# Altium schematic symbol library jlcpcb_2025_04_capacitors_extended_1206.schlib: 2503 symbols (part 3 of 14) (continued)
## 1206F104Z500CT
designator C?  Capacitance: 100nF  (hidden comment: *)
Capacitor, Ceramic (MLCC), 100nF, 50V, Y5V, SMD 1206; Manufacturer: Walsin Tech Corp; Manufacturer Part Number: 1206F104Z500CT; Temperature Rating: -20%~+80%; Package Size: 1206; JLCPCB Basic Part: No; JLCPCB Part Number: C152824; Supplier 1: LCSC; Category: Capacitors - MLCC; Supplier Part Number 1: C152824; Voltage Rating: 50V; Temperature Coefficient: Y5V; RoHS: Yes; ComponentLink1Description: Datasheet; ComponentLink1URL: https://wmsc.lcsc.com/wmsc/upload/file/pdf/v2/lcsc/2304140030_Walsin-Tech-Corp-1206F104Z500CT_C152824.pdf; ComponentLink2Description: JLCPCB Part URL; ComponentLink2URL: https://jlcpcb.com/partdetail/C152824; ComponentLink3Description: LCSC Part URL; ComponentLink3URL: https://lcsc.com/product-detail/Multilayer-Ceramic-Capacitors-MLCC---SMD-SMT_Walsin-Tech-Corp-Walsin-Tech-Corp-1206F104Z500CT_C152824.html
footprint CAP-1206 (1206 (3216M) Capacitor)
pins: 1, 2

## 1206F105M500NT
designator C?  Capacitance: 1uF  (hidden comment: *)
Capacitor, Ceramic (MLCC), 1uF, ±20%, 50V, Y5V, ±20%, SMD 1206; Manufacturer: FH(Guangdong Fenghua Advanced Tech); Manufacturer Part Number: 1206F105M500NT; Package Size: 1206; JLCPCB Basic Part: No; JLCPCB Part Number: C1926; Supplier 1: LCSC; Category: Capacitors - MLCC; Supplier Part Number 1: C1926; Tolerance: ±20%; Voltage Rating: 50V; Temperature Coefficient: Y5V; RoHS: Yes; ComponentLink1Description: Datasheet; ComponentLink1URL: https://wmsc.lcsc.com/wmsc/upload/file/pdf/v2/lcsc/2304140030_FH--Guangdong-Fenghua-Advanced-Tech-1206F105M500NT_C1926.pdf; ComponentLink2Description: JLCPCB Part URL; ComponentLink2URL: https://jlcpcb.com/partdetail/C1926; ComponentLink3Description: LCSC Part URL; ComponentLink3URL: https://lcsc.com/product-detail/Multilayer-Ceramic-Capacitors-MLCC---SMD-SMT_FH-Guangdong-Fenghua-Advanced-Tech-FH-Guangdong-Fenghua-Advanced-Tech-1206F105M500NT_C1926.html
footprint CAP-1206 (1206 (3216M) Capacitor)
pins: 1, 2

## 1206F105Z160CT
designator C?  Capacitance: 1uF  (hidden comment: *)
Capacitor, Ceramic (MLCC), 1uF, 16V, Y5V, SMD 1206; Manufacturer: Walsin Tech Corp; Manufacturer Part Number: 1206F105Z160CT; Temperature Rating: -20%~+80%; Package Size: 1206; JLCPCB Basic Part: No; JLCPCB Part Number: C408911; Supplier 1: LCSC; Category: Capacitors - MLCC; Supplier Part Number 1: C408911; Voltage Rating: 16V; Temperature Coefficient: Y5V; RoHS: Yes; ComponentLink1Description: Datasheet; ComponentLink1URL: https://wmsc.lcsc.com/wmsc/upload/file/pdf/v2/lcsc/2304140030_Walsin-Tech-Corp-1206F105Z160CT_C408911.pdf; ComponentLink2Description: JLCPCB Part URL; ComponentLink2URL: https://jlcpcb.com/partdetail/C408911; ComponentLink3Description: LCSC Part URL; ComponentLink3URL: https://lcsc.com/product-detail/Multilayer-Ceramic-Capacitors-MLCC---SMD-SMT_Walsin-Tech-Corp-Walsin-Tech-Corp-1206F105Z160CT_C408911.html
footprint CAP-1206 (1206 (3216M) Capacitor)
pins: 1, 2

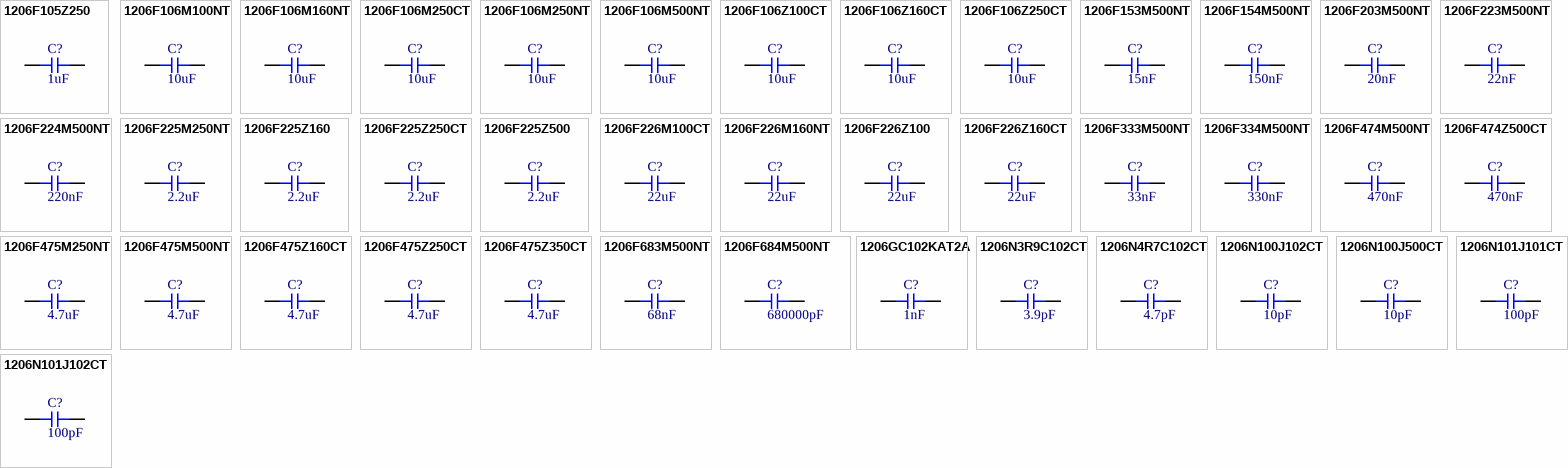
[diagram p10: symbols 1206F105Z250 to 1206N101J102CT]

## 1206F105Z250
designator C?  Capacitance: 1uF  (hidden comment: *)
Capacitor, Ceramic (MLCC), 1uF, 25V, Y5V, SMD 1206; Manufacturer: Walsin Tech Corp; Manufacturer Part Number: 1206F105Z250; Temperature Rating: -20%~+80%; Package Size: 1206; JLCPCB Basic Part: No; JLCPCB Part Number: C123660; Supplier 1: LCSC; Category: Capacitors - MLCC; Supplier Part Number 1: C123660; Voltage Rating: 25V; Temperature Coefficient: Y5V; RoHS: Yes; ComponentLink1Description: Datasheet; ComponentLink1URL: https://wmsc.lcsc.com/wmsc/upload/file/pdf/v2/lcsc/2304140030_Walsin-Tech-Corp-1206F105Z250_C123660.pdf; ComponentLink2Description: JLCPCB Part URL; ComponentLink2URL: https://jlcpcb.com/partdetail/C123660; ComponentLink3Description: LCSC Part URL; ComponentLink3URL: https://lcsc.com/product-detail/Multilayer-Ceramic-Capacitors-MLCC---SMD-SMT_Walsin-Tech-Corp-Walsin-Tech-Corp-1206F105Z250_C123660.html
footprint CAP-1206 (1206 (3216M) Capacitor)
pins: 1, 2

## 1206F106M100NT
designator C?  Capacitance: 10uF  (hidden comment: *)
Capacitor, Ceramic (MLCC), 10uF, ±20%, 16V, Y5V, ±20%, SMD 1206; Manufacturer: FH(Guangdong Fenghua Advanced Tech); Manufacturer Part Number: 1206F106M100NT; Package Size: 1206; JLCPCB Basic Part: No; JLCPCB Part Number: C138602; Supplier 1: LCSC; Category: Capacitors - MLCC; Supplier Part Number 1: C138602; Tolerance: ±20%; Voltage Rating: 16V; Temperature Coefficient: Y5V; RoHS: Yes; ComponentLink1Description: Datasheet; ComponentLink1URL: https://wmsc.lcsc.com/wmsc/upload/file/pdf/v2/lcsc/2304140030_FH--Guangdong-Fenghua-Advanced-Tech-1206F106M100NT_C138602.pdf; ComponentLink2Description: JLCPCB Part URL; ComponentLink2URL: https://jlcpcb.com/partdetail/C138602; ComponentLink3Description: LCSC Part URL; ComponentLink3URL: https://lcsc.com/product-detail/Multilayer-Ceramic-Capacitors-MLCC---SMD-SMT_FH-Guangdong-Fenghua-Advanced-Tech-FH-Guangdong-Fenghua-Advanced-Tech-1206F106M100NT_C138602.html
footprint CAP-1206 (1206 (3216M) Capacitor)
pins: 1, 2

## 1206F106M160NT
designator C?  Capacitance: 10uF  (hidden comment: *)
Capacitor, Ceramic (MLCC), 10uF, ±20%, 16V, Y5V, ±20%, SMD 1206; Manufacturer: FH(Guangdong Fenghua Advanced Tech); Manufacturer Part Number: 1206F106M160NT; Package Size: 1206; JLCPCB Basic Part: No; JLCPCB Part Number: C105476; Supplier 1: LCSC; Category: Capacitors - MLCC; Supplier Part Number 1: C105476; Tolerance: ±20%; Voltage Rating: 16V; Temperature Coefficient: Y5V; RoHS: Yes; ComponentLink1Description: Datasheet; ComponentLink1URL: https://wmsc.lcsc.com/wmsc/upload/file/pdf/v2/lcsc/2304140030_FH--Guangdong-Fenghua-Advanced-Tech-1206F106M160NT_C105476.pdf; ComponentLink2Description: JLCPCB Part URL; ComponentLink2URL: https://jlcpcb.com/partdetail/C105476; ComponentLink3Description: LCSC Part URL; ComponentLink3URL: https://lcsc.com/product-detail/Multilayer-Ceramic-Capacitors-MLCC---SMD-SMT_FH-Guangdong-Fenghua-Advanced-Tech-FH-Guangdong-Fenghua-Advanced-Tech-1206F106M160NT_C105476.html
footprint CAP-1206 (1206 (3216M) Capacitor)
pins: 1, 2

## 1206F106M250CT
designator C?  Capacitance: 10uF  (hidden comment: *)
Capacitor, Ceramic (MLCC), 10uF, ±20%, 25V, Y5V, ±20%, SMD 1206; Manufacturer: Walsin Tech Corp; Manufacturer Part Number: 1206F106M250CT; Package Size: 1206; JLCPCB Basic Part: No; JLCPCB Part Number: C296109; Supplier 1: LCSC; Category: Capacitors - MLCC; Supplier Part Number 1: C296109; Tolerance: ±20%; Voltage Rating: 25V; Temperature Coefficient: Y5V; RoHS: Yes; ComponentLink1Description: Datasheet; ComponentLink1URL: https://wmsc.lcsc.com/wmsc/upload/file/pdf/v2/lcsc/2304140030_Walsin-Tech-Corp-1206F106M250CT_C296109.pdf; ComponentLink2Description: JLCPCB Part URL; ComponentLink2URL: https://jlcpcb.com/partdetail/C296109; ComponentLink3Description: LCSC Part URL; ComponentLink3URL: https://lcsc.com/product-detail/Multilayer-Ceramic-Capacitors-MLCC---SMD-SMT_Walsin-Tech-Corp-Walsin-Tech-Corp-1206F106M250CT_C296109.html
footprint CAP-1206 (1206 (3216M) Capacitor)
pins: 1, 2

## 1206F106M250NT
designator C?  Capacitance: 10uF  (hidden comment: *)
Capacitor, Ceramic (MLCC), 10uF, 25V, Y5V, SMD 1206; Manufacturer: FH(Guangdong Fenghua Advanced Tech); Manufacturer Part Number: 1206F106M250NT; Package Size: 1206; JLCPCB Basic Part: No; JLCPCB Part Number: C3034761; Supplier 1: LCSC; Category: Capacitors - MLCC; Supplier Part Number 1: C3034761; Voltage Rating: 25V; Temperature Coefficient: Y5V; RoHS: Yes; ComponentLink1Description: Datasheet; ComponentLink1URL: https://wmsc.lcsc.com/wmsc/upload/file/pdf/v2/lcsc/2206101730_FH--Guangdong-Fenghua-Advanced-Tech-1206F106M250NT_C3034761.pdf; ComponentLink2Description: JLCPCB Part URL; ComponentLink2URL: https://jlcpcb.com/partdetail/C3034761; ComponentLink3Description: LCSC Part URL; ComponentLink3URL: https://lcsc.com/product-detail/Multilayer-Ceramic-Capacitors-MLCC---SMD-SMT_FH-Guangdong-Fenghua-Advanced-Tech-FH-Guangdong-Fenghua-Advanced-Tech-1206F106M250NT_C3034761.html
footprint CAP-1206 (1206 (3216M) Capacitor)
pins: 1, 2

## 1206F106M500NT
designator C?  Capacitance: 10uF  (hidden comment: *)
Capacitor, Ceramic (MLCC), 10uF, ±20%, 50V, Y5V, ±20%, SMD 1206; Manufacturer: FH(Guangdong Fenghua Advanced Tech); Manufacturer Part Number: 1206F106M500NT; Package Size: 1206; JLCPCB Basic Part: No; JLCPCB Part Number: C110256; Supplier 1: LCSC; Category: Capacitors - MLCC; Supplier Part Number 1: C110256; Tolerance: ±20%; Voltage Rating: 50V; Temperature Coefficient: Y5V; RoHS: Yes; ComponentLink1Description: Datasheet; ComponentLink1URL: https://wmsc.lcsc.com/wmsc/upload/file/pdf/v2/lcsc/2304140030_FH--Guangdong-Fenghua-Advanced-Tech-1206F106M500NT_C110256.pdf; ComponentLink2Description: JLCPCB Part URL; ComponentLink2URL: https://jlcpcb.com/partdetail/C110256; ComponentLink3Description: LCSC Part URL; ComponentLink3URL: https://lcsc.com/product-detail/Multilayer-Ceramic-Capacitors-MLCC---SMD-SMT_FH-Guangdong-Fenghua-Advanced-Tech-FH-Guangdong-Fenghua-Advanced-Tech-1206F106M500NT_C110256.html
footprint CAP-1206 (1206 (3216M) Capacitor)
pins: 1, 2

## 1206F106Z100CT
designator C?  Capacitance: 10uF  (hidden comment: *)
Capacitor, Ceramic (MLCC), 10uF, 10V, Y5V, SMD 1206; Manufacturer: Walsin Tech Corp; Manufacturer Part Number: 1206F106Z100CT; Temperature Rating: -20%~+80%; Package Size: 1206; JLCPCB Basic Part: No; JLCPCB Part Number: C152957; Supplier 1: LCSC; Category: Capacitors - MLCC; Supplier Part Number 1: C152957; Voltage Rating: 10V; Temperature Coefficient: Y5V; RoHS: Yes; ComponentLink1Description: Datasheet; ComponentLink1URL: https://wmsc.lcsc.com/wmsc/upload/file/pdf/v2/lcsc/2304140030_Walsin-Tech-Corp-1206F106Z100CT_C152957.pdf; ComponentLink2Description: JLCPCB Part URL; ComponentLink2URL: https://jlcpcb.com/partdetail/C152957; ComponentLink3Description: LCSC Part URL; ComponentLink3URL: https://lcsc.com/product-detail/Multilayer-Ceramic-Capacitors-MLCC---SMD-SMT_Walsin-Tech-Corp-Walsin-Tech-Corp-1206F106Z100CT_C152957.html
footprint CAP-1206 (1206 (3216M) Capacitor)
pins: 1, 2

## 1206F106Z160CT
designator C?  Capacitance: 10uF  (hidden comment: *)
Capacitor, Ceramic (MLCC), 10uF, 16V, Y5V, SMD 1206; Manufacturer: Walsin Tech Corp; Manufacturer Part Number: 1206F106Z160CT; Temperature Rating: -20%~+80%; Package Size: 1206; JLCPCB Basic Part: No; JLCPCB Part Number: C396769; Supplier 1: LCSC; Category: Capacitors - MLCC; Supplier Part Number 1: C396769; Voltage Rating: 16V; Temperature Coefficient: Y5V; RoHS: Yes; ComponentLink1Description: Datasheet; ComponentLink1URL: https://wmsc.lcsc.com/wmsc/upload/file/pdf/v2/lcsc/2304140030_Walsin-Tech-Corp-1206F106Z160CT_C396769.pdf; ComponentLink2Description: JLCPCB Part URL; ComponentLink2URL: https://jlcpcb.com/partdetail/C396769; ComponentLink3Description: LCSC Part URL; ComponentLink3URL: https://lcsc.com/product-detail/Multilayer-Ceramic-Capacitors-MLCC---SMD-SMT_Walsin-Tech-Corp-Walsin-Tech-Corp-1206F106Z160CT_C396769.html
footprint CAP-1206 (1206 (3216M) Capacitor)
pins: 1, 2

## 1206F106Z250CT
designator C?  Capacitance: 10uF  (hidden comment: *)
Capacitor, Ceramic (MLCC), 10uF, 25V, Y5V, SMD 1206; Manufacturer: Walsin Tech Corp; Manufacturer Part Number: 1206F106Z250CT; Temperature Rating: -20%~+80%; Package Size: 1206; JLCPCB Basic Part: No; JLCPCB Part Number: C296110; Supplier 1: LCSC; Category: Capacitors - MLCC; Supplier Part Number 1: C296110; Voltage Rating: 25V; Temperature Coefficient: Y5V; RoHS: Yes; ComponentLink1Description: Datasheet; ComponentLink1URL: https://wmsc.lcsc.com/wmsc/upload/file/pdf/v2/lcsc/2304140030_Walsin-Tech-Corp-1206F106Z250CT_C296110.pdf; ComponentLink2Description: JLCPCB Part URL; ComponentLink2URL: https://jlcpcb.com/partdetail/C296110; ComponentLink3Description: LCSC Part URL; ComponentLink3URL: https://lcsc.com/product-detail/Multilayer-Ceramic-Capacitors-MLCC---SMD-SMT_Walsin-Tech-Corp-Walsin-Tech-Corp-1206F106Z250CT_C296110.html
footprint CAP-1206 (1206 (3216M) Capacitor)
pins: 1, 2

## 1206F153M500NT
designator C?  Capacitance: 15nF  (hidden comment: *)
Capacitor, Ceramic (MLCC), 15nF, ±20%, 50V, Y5V, ±20%, SMD 1206; Manufacturer: FH(Guangdong Fenghua Advanced Tech); Manufacturer Part Number: 1206F153M500NT; Package Size: 1206; JLCPCB Basic Part: No; JLCPCB Part Number: C1928; Supplier 1: LCSC; Category: Capacitors - MLCC; Supplier Part Number 1: C1928; Tolerance: ±20%; Voltage Rating: 50V; Temperature Coefficient: Y5V; RoHS: Yes; ComponentLink1Description: Datasheet; ComponentLink1URL: https://wmsc.lcsc.com/wmsc/upload/file/pdf/v2/lcsc/2304140030_FH--Guangdong-Fenghua-Advanced-Tech-1206F153M500NT_C1928.pdf; ComponentLink2Description: JLCPCB Part URL; ComponentLink2URL: https://jlcpcb.com/partdetail/C1928; ComponentLink3Description: LCSC Part URL; ComponentLink3URL: https://lcsc.com/product-detail/Multilayer-Ceramic-Capacitors-MLCC---SMD-SMT_FH-Guangdong-Fenghua-Advanced-Tech-FH-Guangdong-Fenghua-Advanced-Tech-1206F153M500NT_C1928.html
footprint CAP-1206 (1206 (3216M) Capacitor)
pins: 1, 2

## 1206F154M500NT
designator C?  Capacitance: 150nF  (hidden comment: *)
Capacitor, Ceramic (MLCC), 150nF, ±20%, 50V, Y5V, ±20%, SMD 1206; Manufacturer: FH(Guangdong Fenghua Advanced Tech); Manufacturer Part Number: 1206F154M500NT; Package Size: 1206; JLCPCB Basic Part: No; JLCPCB Part Number: C1929; Supplier 1: LCSC; Category: Capacitors - MLCC; Supplier Part Number 1: C1929; Tolerance: ±20%; Voltage Rating: 50V; Temperature Coefficient: Y5V; RoHS: Yes; ComponentLink1Description: Datasheet; ComponentLink1URL: https://wmsc.lcsc.com/wmsc/upload/file/pdf/v2/lcsc/2304140030_FH--Guangdong-Fenghua-Advanced-Tech-1206F154M500NT_C1929.pdf; ComponentLink2Description: JLCPCB Part URL; ComponentLink2URL: https://jlcpcb.com/partdetail/C1929; ComponentLink3Description: LCSC Part URL; ComponentLink3URL: https://lcsc.com/product-detail/Multilayer-Ceramic-Capacitors-MLCC---SMD-SMT_FH-Guangdong-Fenghua-Advanced-Tech-FH-Guangdong-Fenghua-Advanced-Tech-1206F154M500NT_C1929.html
footprint CAP-1206 (1206 (3216M) Capacitor)
pins: 1, 2

## 1206F203M500NT
designator C?  Capacitance: 20nF  (hidden comment: *)
Capacitor, Ceramic (MLCC), 20nF, ±20%, 50V, Y5V, ±20%, SMD 1206; Manufacturer: FH(Guangdong Fenghua Advanced Tech); Manufacturer Part Number: 1206F203M500NT; Package Size: 1206; JLCPCB Basic Part: No; JLCPCB Part Number: C1930; Supplier 1: LCSC; Category: Capacitors - MLCC; Supplier Part Number 1: C1930; Tolerance: ±20%; Voltage Rating: 50V; Temperature Coefficient: Y5V; RoHS: Yes; ComponentLink1Description: Datasheet; ComponentLink1URL: https://wmsc.lcsc.com/wmsc/upload/file/pdf/v2/lcsc/2304140030_FH--Guangdong-Fenghua-Advanced-Tech-1206F203M500NT_C1930.pdf; ComponentLink2Description: JLCPCB Part URL; ComponentLink2URL: https://jlcpcb.com/partdetail/C1930; ComponentLink3Description: LCSC Part URL; ComponentLink3URL: https://lcsc.com/product-detail/Multilayer-Ceramic-Capacitors-MLCC---SMD-SMT_FH-Guangdong-Fenghua-Advanced-Tech-FH-Guangdong-Fenghua-Advanced-Tech-1206F203M500NT_C1930.html
footprint CAP-1206 (1206 (3216M) Capacitor)
pins: 1, 2

## 1206F223M500NT
designator C?  Capacitance: 22nF  (hidden comment: *)
Capacitor, Ceramic (MLCC), 22nF, ±20%, 50V, Y5V, ±20%, SMD 1206; Manufacturer: FH(Guangdong Fenghua Advanced Tech); Manufacturer Part Number: 1206F223M500NT; Package Size: 1206; JLCPCB Basic Part: No; JLCPCB Part Number: C1931; Supplier 1: LCSC; Category: Capacitors - MLCC; Supplier Part Number 1: C1931; Tolerance: ±20%; Voltage Rating: 50V; Temperature Coefficient: Y5V; RoHS: Yes; ComponentLink1Description: Datasheet; ComponentLink1URL: https://wmsc.lcsc.com/wmsc/upload/file/pdf/v2/lcsc/2304140030_FH--Guangdong-Fenghua-Advanced-Tech-1206F223M500NT_C1931.pdf; ComponentLink2Description: JLCPCB Part URL; ComponentLink2URL: https://jlcpcb.com/partdetail/C1931; ComponentLink3Description: LCSC Part URL; ComponentLink3URL: https://lcsc.com/product-detail/Multilayer-Ceramic-Capacitors-MLCC---SMD-SMT_FH-Guangdong-Fenghua-Advanced-Tech-FH-Guangdong-Fenghua-Advanced-Tech-1206F223M500NT_C1931.html
footprint CAP-1206 (1206 (3216M) Capacitor)
pins: 1, 2

## 1206F224M500NT
designator C?  Capacitance: 220nF  (hidden comment: *)
Capacitor, Ceramic (MLCC), 220nF, ±20%, 50V, Y5V, ±20%, SMD 1206; Manufacturer: FH(Guangdong Fenghua Advanced Tech); Manufacturer Part Number: 1206F224M500NT; Package Size: 1206; JLCPCB Basic Part: No; JLCPCB Part Number: C1932; Supplier 1: LCSC; Category: Capacitors - MLCC; Supplier Part Number 1: C1932; Tolerance: ±20%; Voltage Rating: 50V; Temperature Coefficient: Y5V; RoHS: Yes; ComponentLink1Description: Datasheet; ComponentLink1URL: https://wmsc.lcsc.com/wmsc/upload/file/pdf/v2/lcsc/2304140030_FH--Guangdong-Fenghua-Advanced-Tech-1206F224M500NT_C1932.pdf; ComponentLink2Description: JLCPCB Part URL; ComponentLink2URL: https://jlcpcb.com/partdetail/C1932; ComponentLink3Description: LCSC Part URL; ComponentLink3URL: https://lcsc.com/product-detail/Multilayer-Ceramic-Capacitors-MLCC---SMD-SMT_FH-Guangdong-Fenghua-Advanced-Tech-FH-Guangdong-Fenghua-Advanced-Tech-1206F224M500NT_C1932.html
footprint CAP-1206 (1206 (3216M) Capacitor)
pins: 1, 2

## 1206F225M250NT
designator C?  Capacitance: 2.2uF  (hidden comment: *)
Capacitor, Ceramic (MLCC), 2.2uF, ±20%, 25V, Y5V, ±20%, SMD 1206; Manufacturer: FH(Guangdong Fenghua Advanced Tech); Manufacturer Part Number: 1206F225M250NT; Package Size: 1206; JLCPCB Basic Part: No; JLCPCB Part Number: C1933; Supplier 1: LCSC; Category: Capacitors - MLCC; Supplier Part Number 1: C1933; Tolerance: ±20%; Voltage Rating: 25V; Temperature Coefficient: Y5V; RoHS: Yes; ComponentLink1Description: Datasheet; ComponentLink1URL: https://wmsc.lcsc.com/wmsc/upload/file/pdf/v2/lcsc/2304140030_FH--Guangdong-Fenghua-Advanced-Tech-1206F225M250NT_C1933.pdf; ComponentLink2Description: JLCPCB Part URL; ComponentLink2URL: https://jlcpcb.com/partdetail/C1933; ComponentLink3Description: LCSC Part URL; ComponentLink3URL: https://lcsc.com/product-detail/Multilayer-Ceramic-Capacitors-MLCC---SMD-SMT_FH-Guangdong-Fenghua-Advanced-Tech-FH-Guangdong-Fenghua-Advanced-Tech-1206F225M250NT_C1933.html
footprint CAP-1206 (1206 (3216M) Capacitor)
pins: 1, 2

## 1206F225Z160
designator C?  Capacitance: 2.2uF  (hidden comment: *)
Capacitor, Ceramic (MLCC), 2.2uF, 16V, Y5V, SMD 1206; Manufacturer: Walsin Tech Corp; Manufacturer Part Number: 1206F225Z160; Temperature Rating: -20%~+80%; Package Size: 1206; JLCPCB Basic Part: No; JLCPCB Part Number: C123662; Supplier 1: LCSC; Category: Capacitors - MLCC; Supplier Part Number 1: C123662; Voltage Rating: 16V; Temperature Coefficient: Y5V; RoHS: Yes; ComponentLink1Description: Datasheet; ComponentLink1URL: https://wmsc.lcsc.com/wmsc/upload/file/pdf/v2/lcsc/2304140030_Walsin-Tech-Corp-1206F225Z160_C123662.pdf; ComponentLink2Description: JLCPCB Part URL; ComponentLink2URL: https://jlcpcb.com/partdetail/C123662; ComponentLink3Description: LCSC Part URL; ComponentLink3URL: https://lcsc.com/product-detail/Multilayer-Ceramic-Capacitors-MLCC---SMD-SMT_Walsin-Tech-Corp-Walsin-Tech-Corp-1206F225Z160_C123662.html
footprint CAP-1206 (1206 (3216M) Capacitor)
pins: 1, 2

## 1206F225Z250CT
designator C?  Capacitance: 2.2uF  (hidden comment: *)
Capacitor, Ceramic (MLCC), 2.2uF, 25V, Y5V, SMD 1206; Manufacturer: Walsin Tech Corp; Manufacturer Part Number: 1206F225Z250CT; Temperature Rating: -20%~+80%; Package Size: 1206; JLCPCB Basic Part: No; JLCPCB Part Number: C152955; Supplier 1: LCSC; Category: Capacitors - MLCC; Supplier Part Number 1: C152955; Voltage Rating: 25V; Temperature Coefficient: Y5V; RoHS: Yes; ComponentLink1Description: Datasheet; ComponentLink1URL: https://wmsc.lcsc.com/wmsc/upload/file/pdf/v2/lcsc/2304140030_Walsin-Tech-Corp-1206F225Z250CT_C152955.pdf; ComponentLink2Description: JLCPCB Part URL; ComponentLink2URL: https://jlcpcb.com/partdetail/C152955; ComponentLink3Description: LCSC Part URL; ComponentLink3URL: https://lcsc.com/product-detail/Multilayer-Ceramic-Capacitors-MLCC---SMD-SMT_Walsin-Tech-Corp-Walsin-Tech-Corp-1206F225Z250CT_C152955.html
footprint CAP-1206 (1206 (3216M) Capacitor)
pins: 1, 2

## 1206F225Z500
designator C?  Capacitance: 2.2uF  (hidden comment: *)
Capacitor, Ceramic (MLCC), 2.2uF, 50V, Y5V, SMD 1206; Manufacturer: Walsin Tech Corp; Manufacturer Part Number: 1206F225Z500; Temperature Rating: -20%~+80%; Package Size: 1206; JLCPCB Basic Part: No; JLCPCB Part Number: C152954; Supplier 1: LCSC; Category: Capacitors - MLCC; Supplier Part Number 1: C152954; Voltage Rating: 50V; Temperature Coefficient: Y5V; RoHS: Yes; ComponentLink1Description: Datasheet; ComponentLink1URL: https://wmsc.lcsc.com/wmsc/upload/file/pdf/v2/lcsc/2304140030_Walsin-Tech-Corp-1206F225Z500_C152954.pdf; ComponentLink2Description: JLCPCB Part URL; ComponentLink2URL: https://jlcpcb.com/partdetail/C152954; ComponentLink3Description: LCSC Part URL; ComponentLink3URL: https://lcsc.com/product-detail/Multilayer-Ceramic-Capacitors-MLCC---SMD-SMT_Walsin-Tech-Corp-Walsin-Tech-Corp-1206F225Z500_C152954.html
footprint CAP-1206 (1206 (3216M) Capacitor)
pins: 1, 2

## 1206F226M100CT
designator C?  Capacitance: 22uF  (hidden comment: *)
Capacitor, Ceramic (MLCC), 22uF, ±20%, 10V, Y5V, ±20%, SMD 1206; Manufacturer: Walsin Tech Corp; Manufacturer Part Number: 1206F226M100CT; Package Size: 1206; JLCPCB Basic Part: No; JLCPCB Part Number: C296111; Supplier 1: LCSC; Category: Capacitors - MLCC; Supplier Part Number 1: C296111; Tolerance: ±20%; Voltage Rating: 10V; Temperature Coefficient: Y5V; RoHS: Yes; ComponentLink1Description: Datasheet; ComponentLink1URL: https://wmsc.lcsc.com/wmsc/upload/file/pdf/v2/lcsc/2304140030_Walsin-Tech-Corp-1206F226M100CT_C296111.pdf; ComponentLink2Description: JLCPCB Part URL; ComponentLink2URL: https://jlcpcb.com/partdetail/C296111; ComponentLink3Description: LCSC Part URL; ComponentLink3URL: https://lcsc.com/product-detail/Multilayer-Ceramic-Capacitors-MLCC---SMD-SMT_Walsin-Tech-Corp-Walsin-Tech-Corp-1206F226M100CT_C296111.html
footprint CAP-1206 (1206 (3216M) Capacitor)
pins: 1, 2

## 1206F226M160NT
designator C?  Capacitance: 22uF  (hidden comment: *)
Capacitor, Ceramic (MLCC), 22uF, ±20%, 16V, Y5V, ±20%, SMD 1206; Manufacturer: FH(Guangdong Fenghua Advanced Tech); Manufacturer Part Number: 1206F226M160NT; Package Size: 1206; JLCPCB Basic Part: No; JLCPCB Part Number: C93135; Supplier 1: LCSC; Category: Capacitors - MLCC; Supplier Part Number 1: C93135; Tolerance: ±20%; Voltage Rating: 16V; Temperature Coefficient: Y5V; RoHS: Yes; ComponentLink1Description: Datasheet; ComponentLink1URL: https://wmsc.lcsc.com/wmsc/upload/file/pdf/v2/lcsc/2304140030_FH--Guangdong-Fenghua-Advanced-Tech-1206F226M160NT_C93135.pdf; ComponentLink2Description: JLCPCB Part URL; ComponentLink2URL: https://jlcpcb.com/partdetail/C93135; ComponentLink3Description: LCSC Part URL; ComponentLink3URL: https://lcsc.com/product-detail/Multilayer-Ceramic-Capacitors-MLCC---SMD-SMT_FH-Guangdong-Fenghua-Advanced-Tech-FH-Guangdong-Fenghua-Advanced-Tech-1206F226M160NT_C93135.html
footprint CAP-1206 (1206 (3216M) Capacitor)
pins: 1, 2

## 1206F226Z100
designator C?  Capacitance: 22uF  (hidden comment: *)
Capacitor, Ceramic (MLCC), 22uF, 10V, Y5V, SMD 1206; Manufacturer: Walsin Tech Corp; Manufacturer Part Number: 1206F226Z100; Temperature Rating: -20%~+80%; Package Size: 1206; JLCPCB Basic Part: No; JLCPCB Part Number: C152992; Supplier 1: LCSC; Category: Capacitors - MLCC; Supplier Part Number 1: C152992; Voltage Rating: 10V; Temperature Coefficient: Y5V; RoHS: Yes; ComponentLink1Description: Datasheet; ComponentLink1URL: https://wmsc.lcsc.com/wmsc/upload/file/pdf/v2/lcsc/2304140030_Walsin-Tech-Corp-1206F226Z100_C152992.pdf; ComponentLink2Description: JLCPCB Part URL; ComponentLink2URL: https://jlcpcb.com/partdetail/C152992; ComponentLink3Description: LCSC Part URL; ComponentLink3URL: https://lcsc.com/product-detail/Multilayer-Ceramic-Capacitors-MLCC---SMD-SMT_Walsin-Tech-Corp-Walsin-Tech-Corp-1206F226Z100_C152992.html
footprint CAP-1206 (1206 (3216M) Capacitor)
pins: 1, 2

## 1206F226Z160CT
designator C?  Capacitance: 22uF  (hidden comment: *)
Capacitor, Ceramic (MLCC), 22uF, 16V, Y5V, SMD 1206; Manufacturer: Walsin Tech Corp; Manufacturer Part Number: 1206F226Z160CT; Temperature Rating: -20%~+80%; Package Size: 1206; JLCPCB Basic Part: No; JLCPCB Part Number: C396771; Supplier 1: LCSC; Category: Capacitors - MLCC; Supplier Part Number 1: C396771; Voltage Rating: 16V; Temperature Coefficient: Y5V; RoHS: Yes; ComponentLink1Description: Datasheet; ComponentLink1URL: https://wmsc.lcsc.com/wmsc/upload/file/pdf/v2/lcsc/2304140030_Walsin-Tech-Corp-1206F226Z160CT_C396771.pdf; ComponentLink2Description: JLCPCB Part URL; ComponentLink2URL: https://jlcpcb.com/partdetail/C396771; ComponentLink3Description: LCSC Part URL; ComponentLink3URL: https://lcsc.com/product-detail/Multilayer-Ceramic-Capacitors-MLCC---SMD-SMT_Walsin-Tech-Corp-Walsin-Tech-Corp-1206F226Z160CT_C396771.html
footprint CAP-1206 (1206 (3216M) Capacitor)
pins: 1, 2

## 1206F333M500NT
designator C?  Capacitance: 33nF  (hidden comment: *)
Capacitor, Ceramic (MLCC), 33nF, ±20%, 50V, Y5V, ±20%, SMD 1206; Manufacturer: FH(Guangdong Fenghua Advanced Tech); Manufacturer Part Number: 1206F333M500NT; Package Size: 1206; JLCPCB Basic Part: No; JLCPCB Part Number: C1935; Supplier 1: LCSC; Category: Capacitors - MLCC; Supplier Part Number 1: C1935; Tolerance: ±20%; Voltage Rating: 50V; Temperature Coefficient: Y5V; RoHS: Yes; ComponentLink1Description: Datasheet; ComponentLink1URL: https://wmsc.lcsc.com/wmsc/upload/file/pdf/v2/lcsc/2304140030_FH--Guangdong-Fenghua-Advanced-Tech-1206F333M500NT_C1935.pdf; ComponentLink2Description: JLCPCB Part URL; ComponentLink2URL: https://jlcpcb.com/partdetail/C1935; ComponentLink3Description: LCSC Part URL; ComponentLink3URL: https://lcsc.com/product-detail/Multilayer-Ceramic-Capacitors-MLCC---SMD-SMT_FH-Guangdong-Fenghua-Advanced-Tech-FH-Guangdong-Fenghua-Advanced-Tech-1206F333M500NT_C1935.html
footprint CAP-1206 (1206 (3216M) Capacitor)
pins: 1, 2

## 1206F334M500NT
designator C?  Capacitance: 330nF  (hidden comment: *)
Capacitor, Ceramic (MLCC), 330nF, ±20%, 50V, Y5V, ±20%, SMD 1206; Manufacturer: FH(Guangdong Fenghua Advanced Tech); Manufacturer Part Number: 1206F334M500NT; Package Size: 1206; JLCPCB Basic Part: No; JLCPCB Part Number: C1936; Supplier 1: LCSC; Category: Capacitors - MLCC; Supplier Part Number 1: C1936; Tolerance: ±20%; Voltage Rating: 50V; Temperature Coefficient: Y5V; RoHS: Yes; ComponentLink1Description: Datasheet; ComponentLink1URL: https://wmsc.lcsc.com/wmsc/upload/file/pdf/v2/lcsc/2304140030_FH--Guangdong-Fenghua-Advanced-Tech-1206F334M500NT_C1936.pdf; ComponentLink2Description: JLCPCB Part URL; ComponentLink2URL: https://jlcpcb.com/partdetail/C1936; ComponentLink3Description: LCSC Part URL; ComponentLink3URL: https://lcsc.com/product-detail/Multilayer-Ceramic-Capacitors-MLCC---SMD-SMT_FH-Guangdong-Fenghua-Advanced-Tech-FH-Guangdong-Fenghua-Advanced-Tech-1206F334M500NT_C1936.html
footprint CAP-1206 (1206 (3216M) Capacitor)
pins: 1, 2

## 1206F474M500NT
designator C?  Capacitance: 470nF  (hidden comment: *)
Capacitor, Ceramic (MLCC), 470nF, ±20%, 50V, Y5V, ±20%, SMD 1206; Manufacturer: FH(Guangdong Fenghua Advanced Tech); Manufacturer Part Number: 1206F474M500NT; Package Size: 1206; JLCPCB Basic Part: No; JLCPCB Part Number: C1938; Supplier 1: LCSC; Category: Capacitors - MLCC; Supplier Part Number 1: C1938; Tolerance: ±20%; Voltage Rating: 50V; Temperature Coefficient: Y5V; RoHS: Yes; ComponentLink1Description: Datasheet; ComponentLink1URL: https://wmsc.lcsc.com/wmsc/upload/file/pdf/v2/lcsc/2304140030_FH--Guangdong-Fenghua-Advanced-Tech-1206F474M500NT_C1938.pdf; ComponentLink2Description: JLCPCB Part URL; ComponentLink2URL: https://jlcpcb.com/partdetail/C1938; ComponentLink3Description: LCSC Part URL; ComponentLink3URL: https://lcsc.com/product-detail/Multilayer-Ceramic-Capacitors-MLCC---SMD-SMT_FH-Guangdong-Fenghua-Advanced-Tech-FH-Guangdong-Fenghua-Advanced-Tech-1206F474M500NT_C1938.html
footprint CAP-1206 (1206 (3216M) Capacitor)
pins: 1, 2

## 1206F474Z500CT
designator C?  Capacitance: 470nF  (hidden comment: *)
Capacitor, Ceramic (MLCC), 470nF, 50V, Y5V, SMD 1206; Manufacturer: Walsin Tech Corp; Manufacturer Part Number: 1206F474Z500CT; Temperature Rating: -20%~+80%; Package Size: 1206; JLCPCB Basic Part: No; JLCPCB Part Number: C384728; Supplier 1: LCSC; Category: Capacitors - MLCC; Supplier Part Number 1: C384728; Voltage Rating: 50V; Temperature Coefficient: Y5V; RoHS: Yes; ComponentLink1Description: Datasheet; ComponentLink1URL: https://wmsc.lcsc.com/wmsc/upload/file/pdf/v2/lcsc/2304140030_Walsin-Tech-Corp-1206F474Z500CT_C384728.pdf; ComponentLink2Description: JLCPCB Part URL; ComponentLink2URL: https://jlcpcb.com/partdetail/C384728; ComponentLink3Description: LCSC Part URL; ComponentLink3URL: https://lcsc.com/product-detail/Multilayer-Ceramic-Capacitors-MLCC---SMD-SMT_Walsin-Tech-Corp-Walsin-Tech-Corp-1206F474Z500CT_C384728.html
footprint CAP-1206 (1206 (3216M) Capacitor)
pins: 1, 2

## 1206F475M250NT
designator C?  Capacitance: 4.7uF  (hidden comment: *)
Capacitor, Ceramic (MLCC), 4.7uF, ±20%, 25V, Y5V, ±20%, SMD 1206; Manufacturer: FH(Guangdong Fenghua Advanced Tech); Manufacturer Part Number: 1206F475M250NT; Package Size: 1206; JLCPCB Basic Part: No; JLCPCB Part Number: C1939; Supplier 1: LCSC; Category: Capacitors - MLCC; Supplier Part Number 1: C1939; Tolerance: ±20%; Voltage Rating: 25V; Temperature Coefficient: Y5V; RoHS: Yes; ComponentLink1Description: Datasheet; ComponentLink1URL: https://wmsc.lcsc.com/wmsc/upload/file/pdf/v2/lcsc/2304140030_FH--Guangdong-Fenghua-Advanced-Tech-1206F475M250NT_C1939.pdf; ComponentLink2Description: JLCPCB Part URL; ComponentLink2URL: https://jlcpcb.com/partdetail/C1939; ComponentLink3Description: LCSC Part URL; ComponentLink3URL: https://lcsc.com/product-detail/Multilayer-Ceramic-Capacitors-MLCC---SMD-SMT_FH-Guangdong-Fenghua-Advanced-Tech-FH-Guangdong-Fenghua-Advanced-Tech-1206F475M250NT_C1939.html
footprint CAP-1206 (1206 (3216M) Capacitor)
pins: 1, 2

## 1206F475M500NT
designator C?  Capacitance: 4.7uF  (hidden comment: *)
Capacitor, Ceramic (MLCC), 4.7uF, ±20%, 50V, Y5V, ±20%, SMD 1206; Manufacturer: FH(Guangdong Fenghua Advanced Tech); Manufacturer Part Number: 1206F475M500NT; Package Size: 1206; JLCPCB Basic Part: No; JLCPCB Part Number: C510958; Supplier 1: LCSC; Category: Capacitors - MLCC; Supplier Part Number 1: C510958; Tolerance: ±20%; Voltage Rating: 50V; Temperature Coefficient: Y5V; RoHS: Yes; ComponentLink1Description: Datasheet; ComponentLink1URL: https://wmsc.lcsc.com/wmsc/upload/file/pdf/v2/lcsc/2304140030_FH--Guangdong-Fenghua-Advanced-Tech-1206F475M500NT_C510958.pdf; ComponentLink2Description: JLCPCB Part URL; ComponentLink2URL: https://jlcpcb.com/partdetail/C510958; ComponentLink3Description: LCSC Part URL; ComponentLink3URL: https://lcsc.com/product-detail/Multilayer-Ceramic-Capacitors-MLCC---SMD-SMT_FH-Guangdong-Fenghua-Advanced-Tech-FH-Guangdong-Fenghua-Advanced-Tech-1206F475M500NT_C510958.html
footprint CAP-1206 (1206 (3216M) Capacitor)
pins: 1, 2

## 1206F475Z160CT
designator C?  Capacitance: 4.7uF  (hidden comment: *)
Capacitor, Ceramic (MLCC), 4.7uF, 16V, Y5V, SMD 1206; Manufacturer: Walsin Tech Corp; Manufacturer Part Number: 1206F475Z160CT; Temperature Rating: -20%~+80%; Package Size: 1206; JLCPCB Basic Part: No; JLCPCB Part Number: C303965; Supplier 1: LCSC; Category: Capacitors - MLCC; Supplier Part Number 1: C303965; Voltage Rating: 16V; Temperature Coefficient: Y5V; RoHS: Yes; ComponentLink1Description: Datasheet; ComponentLink1URL: https://wmsc.lcsc.com/wmsc/upload/file/pdf/v2/lcsc/2304140030_Walsin-Tech-Corp-1206F475Z160CT_C303965.pdf; ComponentLink2Description: JLCPCB Part URL; ComponentLink2URL: https://jlcpcb.com/partdetail/C303965; ComponentLink3Description: LCSC Part URL; ComponentLink3URL: https://lcsc.com/product-detail/Multilayer-Ceramic-Capacitors-MLCC---SMD-SMT_Walsin-Tech-Corp-Walsin-Tech-Corp-1206F475Z160CT_C303965.html
footprint CAP-1206 (1206 (3216M) Capacitor)
pins: 1, 2

## 1206F475Z250CT
designator C?  Capacitance: 4.7uF  (hidden comment: *)
Capacitor, Ceramic (MLCC), 4.7uF, 25V, Y5V, SMD 1206; Manufacturer: Walsin Tech Corp; Manufacturer Part Number: 1206F475Z250CT; Temperature Rating: -20%~+80%; Package Size: 1206; JLCPCB Basic Part: No; JLCPCB Part Number: C396772; Supplier 1: LCSC; Category: Capacitors - MLCC; Supplier Part Number 1: C396772; Voltage Rating: 25V; Temperature Coefficient: Y5V; RoHS: Yes; ComponentLink1Description: Datasheet; ComponentLink1URL: https://wmsc.lcsc.com/wmsc/upload/file/pdf/v2/lcsc/2304140030_Walsin-Tech-Corp-1206F475Z250CT_C396772.pdf; ComponentLink2Description: JLCPCB Part URL; ComponentLink2URL: https://jlcpcb.com/partdetail/C396772; ComponentLink3Description: LCSC Part URL; ComponentLink3URL: https://lcsc.com/product-detail/Multilayer-Ceramic-Capacitors-MLCC---SMD-SMT_Walsin-Tech-Corp-Walsin-Tech-Corp-1206F475Z250CT_C396772.html
footprint CAP-1206 (1206 (3216M) Capacitor)
pins: 1, 2

## 1206F475Z350CT
designator C?  Capacitance: 4.7uF  (hidden comment: *)
Capacitor, Ceramic (MLCC), 4.7uF, Y5V, SMD 1206; Manufacturer: Walsin Tech Corp; Manufacturer Part Number: 1206F475Z350CT; Temperature Rating: -20%~+80%; Package Size: 1206; JLCPCB Basic Part: No; JLCPCB Part Number: C296112; Supplier 1: LCSC; Category: Capacitors - MLCC; Supplier Part Number 1: C296112; Temperature Coefficient: Y5V; RoHS: Yes; ComponentLink1Description: Datasheet; ComponentLink1URL: https://wmsc.lcsc.com/wmsc/upload/file/pdf/v2/lcsc/2304140030_Walsin-Tech-Corp-1206F475Z350CT_C296112.pdf; ComponentLink2Description: JLCPCB Part URL; ComponentLink2URL: https://jlcpcb.com/partdetail/C296112; ComponentLink3Description: LCSC Part URL; ComponentLink3URL: https://lcsc.com/product-detail/Multilayer-Ceramic-Capacitors-MLCC---SMD-SMT_Walsin-Tech-Corp-Walsin-Tech-Corp-1206F475Z350CT_C296112.html
footprint CAP-1206 (1206 (3216M) Capacitor)
pins: 1, 2

## 1206F683M500NT
designator C?  Capacitance: 68nF  (hidden comment: *)
Capacitor, Ceramic (MLCC), 68nF, ±20%, 50V, Y5V, ±20%, SMD 1206; Manufacturer: FH(Guangdong Fenghua Advanced Tech); Manufacturer Part Number: 1206F683M500NT; Package Size: 1206; JLCPCB Basic Part: No; JLCPCB Part Number: C1940; Supplier 1: LCSC; Category: Capacitors - MLCC; Supplier Part Number 1: C1940; Tolerance: ±20%; Voltage Rating: 50V; Temperature Coefficient: Y5V; RoHS: Yes; ComponentLink1Description: Datasheet; ComponentLink1URL: https://wmsc.lcsc.com/wmsc/upload/file/pdf/v2/lcsc/2304140030_FH--Guangdong-Fenghua-Advanced-Tech-1206F683M500NT_C1940.pdf; ComponentLink2Description: JLCPCB Part URL; ComponentLink2URL: https://jlcpcb.com/partdetail/C1940; ComponentLink3Description: LCSC Part URL; ComponentLink3URL: https://lcsc.com/product-detail/Multilayer-Ceramic-Capacitors-MLCC---SMD-SMT_FH-Guangdong-Fenghua-Advanced-Tech-FH-Guangdong-Fenghua-Advanced-Tech-1206F683M500NT_C1940.html
footprint CAP-1206 (1206 (3216M) Capacitor)
pins: 1, 2

## 1206F684M500NT
designator C?  Capacitance: 680000pF  (hidden comment: *)
Capacitor, Ceramic (MLCC), 680000pF, ±20%, 50V, Y5V, ±20%, SMD 1206; Manufacturer: FH (Guangdong Fenghua Advanced Tech); Manufacturer Part Number: 1206F684M500NT; Package Size: 1206; JLCPCB Basic Part: No; JLCPCB Part Number: C2843090; Supplier 1: LCSC; Category: Capacitors - MLCC; Supplier Part Number 1: C2843090; Tolerance: ±20%; Voltage Rating: 50V; Temperature Coefficient: Y5V; RoHS: Yes; ComponentLink1Description: Datasheet; ComponentLink1URL: https://wmsc.lcsc.com/wmsc/upload/file/pdf/v2/lcsc/2202132030_FH--Guangdong-Fenghua-Advanced-Tech-1206F684M500NT_C2843090.pdf; ComponentLink2Description: JLCPCB Part URL; ComponentLink2URL: https://jlcpcb.com/partdetail/C2843090; ComponentLink3Description: LCSC Part URL; ComponentLink3URL: https://lcsc.com/product-detail/Multilayer-Ceramic-Capacitors-MLCC---SMD-SMT_FH-Guangdong-Fenghua-Advanced-Tech-FH-Guangdong-Fenghua-Advanced-Tech-1206F684M500NT_C2843090.html
footprint CAP-1206 (1206 (3216M) Capacitor)
pins: 1, 2

## 1206GC102KAT2A
designator C?  Capacitance: 1nF  (hidden comment: *)
Capacitor, Ceramic (MLCC), 1nF, ±10%, 2kV, X7R, ±10%, SMD 1206; Manufacturer: Kyocera AVX; Manufacturer Part Number: 1206GC102KAT2A; Package Size: 1206; JLCPCB Basic Part: No; JLCPCB Part Number: C2167494; Supplier 1: LCSC; Category: Capacitors - MLCC; Supplier Part Number 1: C2167494; Tolerance: ±10%; Voltage Rating: 2kV; Temperature Coefficient: X7R; RoHS: Yes; ComponentLink1Description: Datasheet; ComponentLink1URL: https://wmsc.lcsc.com/wmsc/upload/file/pdf/v2/lcsc/2309151035_Kyocera-AVX-1206GC102KAT2A_C2167494.pdf; ComponentLink2Description: JLCPCB Part URL; ComponentLink2URL: https://jlcpcb.com/partdetail/C2167494; ComponentLink3Description: LCSC Part URL; ComponentLink3URL: https://lcsc.com/product-detail/Multilayer-Ceramic-Capacitors-MLCC---SMD-SMT_Kyocera-AVX-Kyocera-AVX-1206GC102KAT2A_C2167494.html
footprint CAP-1206 (1206 (3216M) Capacitor)
pins: 1, 2

## 1206N3R9C102CT
designator C?  Capacitance: 3.9pF  (hidden comment: *)
Capacitor, Ceramic (MLCC), 3.9pF, 1kV, C0G, SMD 1206; Manufacturer: Walsin Tech Corp; Manufacturer Part Number: 1206N3R9C102CT; Package Size: 1206; JLCPCB Basic Part: No; JLCPCB Part Number: C3867842; Supplier 1: LCSC; Category: Capacitors - MLCC; Supplier Part Number 1: C3867842; Voltage Rating: 1kV; Temperature Coefficient: C0G; RoHS: Yes; ComponentLink1Description: Datasheet; ComponentLink1URL: https://wmsc.lcsc.com/wmsc/upload/file/pdf/v2/lcsc/2401181704_Walsin-Tech-Corp-1206N3R9C102CT_C3867842.pdf; ComponentLink2Description: JLCPCB Part URL; ComponentLink2URL: https://jlcpcb.com/partdetail/C3867842; ComponentLink3Description: LCSC Part URL; ComponentLink3URL: https://lcsc.com/product-detail/Multilayer-Ceramic-Capacitors-MLCC---SMD-SMT_Walsin-Tech-Corp-Walsin-Tech-Corp-1206N3R9C102CT_C3867842.html
footprint CAP-1206 (1206 (3216M) Capacitor)
pins: 1, 2

## 1206N4R7C102CT
designator C?  Capacitance: 4.7pF  (hidden comment: *)
Capacitor, Ceramic (MLCC), 4.7pF, 1kV, NP0, SMD 1206; Manufacturer: Walsin Tech Corp; Manufacturer Part Number: 1206N4R7C102CT; Package Size: 1206; JLCPCB Basic Part: No; JLCPCB Part Number: C2840257; Supplier 1: LCSC; Category: Capacitors - MLCC; Supplier Part Number 1: C2840257; Voltage Rating: 1kV; Temperature Coefficient: NP0; RoHS: Yes; ComponentLink1Description: Datasheet; ComponentLink1URL: https://wmsc.lcsc.com/wmsc/upload/file/pdf/v2/lcsc/2304140030_Walsin-Tech-Corp-1206N4R7C102CT_C2840257.pdf; ComponentLink2Description: JLCPCB Part URL; ComponentLink2URL: https://jlcpcb.com/partdetail/C2840257; ComponentLink3Description: LCSC Part URL; ComponentLink3URL: https://lcsc.com/product-detail/Multilayer-Ceramic-Capacitors-MLCC---SMD-SMT_Walsin-Tech-Corp-Walsin-Tech-Corp-1206N4R7C102CT_C2840257.html
footprint CAP-1206 (1206 (3216M) Capacitor)
pins: 1, 2

## 1206N100J102CT
designator C?  Capacitance: 10pF  (hidden comment: *)
Capacitor, Ceramic (MLCC), 10pF, ±5%, 1kV, NP0, ±5%, SMD 1206; Manufacturer: Walsin Tech Corp; Manufacturer Part Number: 1206N100J102CT; Package Size: 1206; JLCPCB Basic Part: No; JLCPCB Part Number: C77525; Supplier 1: LCSC; Category: Capacitors - MLCC; Supplier Part Number 1: C77525; Tolerance: ±5%; Voltage Rating: 1kV; Temperature Coefficient: NP0; RoHS: Yes; ComponentLink1Description: Datasheet; ComponentLink2Description: JLCPCB Part URL; ComponentLink2URL: https://jlcpcb.com/partdetail/C77525; ComponentLink3Description: LCSC Part URL; ComponentLink3URL: https://lcsc.com/product-detail/Multilayer-Ceramic-Capacitors-MLCC---SMD-SMT_Walsin-Tech-Corp-Walsin-Tech-Corp-1206N100J102CT_C77525.html
footprint CAP-1206 (1206 (3216M) Capacitor)
pins: 1, 2

## 1206N100J500CT
designator C?  Capacitance: 10pF  (hidden comment: *)
Capacitor, Ceramic (MLCC), 10pF, ±5%, 50V, NP0, ±5%, SMD 1206; Manufacturer: Walsin Tech Corp; Manufacturer Part Number: 1206N100J500CT; Package Size: 1206; JLCPCB Basic Part: No; JLCPCB Part Number: C2840255; Supplier 1: LCSC; Category: Capacitors - MLCC; Supplier Part Number 1: C2840255; Tolerance: ±5%; Voltage Rating: 50V; Temperature Coefficient: NP0; RoHS: Yes; ComponentLink1Description: Datasheet; ComponentLink1URL: https://wmsc.lcsc.com/wmsc/upload/file/pdf/v2/lcsc/2304140030_Walsin-Tech-Corp-1206N100J500CT_C2840255.pdf; ComponentLink2Description: JLCPCB Part URL; ComponentLink2URL: https://jlcpcb.com/partdetail/C2840255; ComponentLink3Description: LCSC Part URL; ComponentLink3URL: https://lcsc.com/product-detail/Multilayer-Ceramic-Capacitors-MLCC---SMD-SMT_Walsin-Tech-Corp-Walsin-Tech-Corp-1206N100J500CT_C2840255.html
footprint CAP-1206 (1206 (3216M) Capacitor)
pins: 1, 2

## 1206N101J101CT
designator C?  Capacitance: 100pF  (hidden comment: *)
Capacitor, Ceramic (MLCC), 100pF, ±5%, 100V, NP0, ±5%, SMD 1206; Manufacturer: Walsin Tech Corp; Manufacturer Part Number: 1206N101J101CT; Package Size: 1206; JLCPCB Basic Part: No; JLCPCB Part Number: C2992630; Supplier 1: LCSC; Category: Capacitors - MLCC; Supplier Part Number 1: C2992630; Tolerance: ±5%; Voltage Rating: 100V; Temperature Coefficient: NP0; RoHS: Yes; ComponentLink1Description: Datasheet; ComponentLink1URL: https://wmsc.lcsc.com/wmsc/upload/file/pdf/v2/lcsc/2204121445_Walsin-Tech-Corp-1206N101J101CT_C2992630.pdf; ComponentLink2Description: JLCPCB Part URL; ComponentLink2URL: https://jlcpcb.com/partdetail/C2992630; ComponentLink3Description: LCSC Part URL; ComponentLink3URL: https://lcsc.com/product-detail/Multilayer-Ceramic-Capacitors-MLCC---SMD-SMT_Walsin-Tech-Corp-Walsin-Tech-Corp-1206N101J101CT_C2992630.html
footprint CAP-1206 (1206 (3216M) Capacitor)
pins: 1, 2

## 1206N101J102CT
designator C?  Capacitance: 100pF  (hidden comment: *)
Capacitor, Ceramic (MLCC), 100pF, ±5%, 1kV, NP0, ±5%, SMD 1206; Manufacturer: Walsin Tech Corp; Manufacturer Part Number: 1206N101J102CT; Package Size: 1206; JLCPCB Basic Part: No; JLCPCB Part Number: C338132; Supplier 1: LCSC; Category: Capacitors - MLCC; Supplier Part Number 1: C338132; Tolerance: ±5%; Voltage Rating: 1kV; Temperature Coefficient: NP0; RoHS: Yes; ComponentLink1Description: Datasheet; ComponentLink1URL: https://wmsc.lcsc.com/wmsc/upload/file/pdf/v2/lcsc/2304140030_Walsin-Tech-Corp-1206N101J102CT_C338132.pdf; ComponentLink2Description: JLCPCB Part URL; ComponentLink2URL: https://jlcpcb.com/partdetail/C338132; ComponentLink3Description: LCSC Part URL; ComponentLink3URL: https://lcsc.com/product-detail/Multilayer-Ceramic-Capacitors-MLCC---SMD-SMT_Walsin-Tech-Corp-Walsin-Tech-Corp-1206N101J102CT_C338132.html
footprint CAP-1206 (1206 (3216M) Capacitor)
pins: 1, 2
